# Altium schematic symbol library jlcpcb_2025_04_capacitors_extended_0201.schlib: 1175 symbols (part 5 of 7) (continued)
## GRM035R60J475ME15D
designator C?  Capacitance: 4.7uF  (hidden comment: *)
Capacitor, Ceramic (MLCC), 4.7uF, ±20%, 6.3V, X5R, ±20%, SMD 0201; Manufacturer: Murata Electronics; Manufacturer Part Number: GRM035R60J475ME15D; Package Size: 0201; JLCPCB Basic Part: No; JLCPCB Part Number: C335103; Supplier 1: LCSC; Category: Capacitors - MLCC; Supplier Part Number 1: C335103; Tolerance: ±20%; Voltage Rating: 6.3V; Temperature Coefficient: X5R; RoHS: Yes; ComponentLink1Description: Datasheet; ComponentLink1URL: https://wmsc.lcsc.com/wmsc/upload/file/pdf/v2/lcsc/2304140030_Murata-Electronics-GRM035R60J475ME15D_C335103.pdf; ComponentLink2Description: JLCPCB Part URL; ComponentLink2URL: https://jlcpcb.com/partdetail/C335103; ComponentLink3Description: LCSC Part URL; ComponentLink3URL: https://lcsc.com/product-detail/Multilayer-Ceramic-Capacitors-MLCC---SMD-SMT_Murata-Electronics-Murata-Electronics-GRM035R60J475ME15D_C335103.html
footprint CAP-0201 (0201 (0603M) Capacitor)
pins: 1, 2

## GRM0332C1H8R0WA01D
designator C?  Capacitance: 8pF  (hidden comment: *)
Capacitor, Ceramic (MLCC), 8pF, 50V, CH, SMD 0201; Manufacturer: Murata Electronics; Manufacturer Part Number: GRM0332C1H8R0WA01D; Package Size: 0201; JLCPCB Basic Part: No; JLCPCB Part Number: C161366; Supplier 1: LCSC; Category: Capacitors - MLCC; Supplier Part Number 1: C161366; Voltage Rating: 50V; Temperature Coefficient: CH; RoHS: Yes; ComponentLink1Description: Datasheet; ComponentLink1URL: https://wmsc.lcsc.com/wmsc/upload/file/pdf/v2/lcsc/1811081551_Murata-Electronics-GRM0332C1H8R0WA01D_C161366.pdf; ComponentLink2Description: JLCPCB Part URL; ComponentLink2URL: https://jlcpcb.com/partdetail/C161366; ComponentLink3Description: LCSC Part URL; ComponentLink3URL: https://lcsc.com/product-detail/Multilayer-Ceramic-Capacitors-MLCC---SMD-SMT_Murata-Electronics-Murata-Electronics-GRM0332C1H8R0WA01D_C161366.html
footprint CAP-0201 (0201 (0603M) Capacitor)
pins: 1, 2

## GRM0332C1H180GA01D
designator C?  Capacitance: 18pF  (hidden comment: *)
Capacitor, Ceramic (MLCC), 18pF, ±2%, 50V, CH, ±2%, SMD 0201; Manufacturer: Murata Electronics; Manufacturer Part Number: GRM0332C1H180GA01D; Package Size: 0201; JLCPCB Basic Part: No; JLCPCB Part Number: C161364; Supplier 1: LCSC; Category: Capacitors - MLCC; Supplier Part Number 1: C161364; Tolerance: ±2%; Voltage Rating: 50V; Temperature Coefficient: CH; RoHS: Yes; ComponentLink1Description: Datasheet; ComponentLink1URL: https://wmsc.lcsc.com/wmsc/upload/file/pdf/v2/lcsc/1811081551_Murata-Electronics-GRM0332C1H180GA01D_C161364.pdf; ComponentLink2Description: JLCPCB Part URL; ComponentLink2URL: https://jlcpcb.com/partdetail/C161364; ComponentLink3Description: LCSC Part URL; ComponentLink3URL: https://lcsc.com/product-detail/Multilayer-Ceramic-Capacitors-MLCC---SMD-SMT_Murata-Electronics-Murata-Electronics-GRM0332C1H180GA01D_C161364.html
footprint CAP-0201 (0201 (0603M) Capacitor)
pins: 1, 2

## GRM0332C1H680GA01D
designator C?  Capacitance: 68pF  (hidden comment: *)
Capacitor, Ceramic (MLCC), 68pF, ±2%, 50V, CH, ±2%, SMD 0201; Manufacturer: Murata Electronics; Manufacturer Part Number: GRM0332C1H680GA01D; Package Size: 0201; JLCPCB Basic Part: No; JLCPCB Part Number: C161365; Supplier 1: LCSC; Category: Capacitors - MLCC; Supplier Part Number 1: C161365; Tolerance: ±2%; Voltage Rating: 50V; Temperature Coefficient: CH; RoHS: Yes; ComponentLink1Description: Datasheet; ComponentLink1URL: https://wmsc.lcsc.com/wmsc/upload/file/pdf/v2/lcsc/1811081513_Murata-Electronics-GRM0332C1H680GA01D_C161365.pdf; ComponentLink2Description: JLCPCB Part URL; ComponentLink2URL: https://jlcpcb.com/partdetail/C161365; ComponentLink3Description: LCSC Part URL; ComponentLink3URL: https://lcsc.com/product-detail/Multilayer-Ceramic-Capacitors-MLCC---SMD-SMT_Murata-Electronics-Murata-Electronics-GRM0332C1H680GA01D_C161365.html
footprint CAP-0201 (0201 (0603M) Capacitor)
pins: 1, 2

## GRM0333C1H2R2WA01D
designator C?  Capacitance: 2.2pF  (hidden comment: *)
Capacitor, Ceramic (MLCC), 2.2pF, 50V, CJ, SMD 0201; Manufacturer: Murata Electronics; Manufacturer Part Number: GRM0333C1H2R2WA01D; Package Size: 0201; JLCPCB Basic Part: No; JLCPCB Part Number: C161367; Supplier 1: LCSC; Category: Capacitors - MLCC; Supplier Part Number 1: C161367; Voltage Rating: 50V; Temperature Coefficient: CJ; RoHS: Yes; ComponentLink1Description: Datasheet; ComponentLink1URL: https://wmsc.lcsc.com/wmsc/upload/file/pdf/v2/lcsc/2304140030_Murata-Electronics-GRM0333C1H2R2WA01D_C161367.pdf; ComponentLink2Description: JLCPCB Part URL; ComponentLink2URL: https://jlcpcb.com/partdetail/C161367; ComponentLink3Description: LCSC Part URL; ComponentLink3URL: https://lcsc.com/product-detail/Multilayer-Ceramic-Capacitors-MLCC---SMD-SMT_Murata-Electronics-Murata-Electronics-GRM0333C1H2R2WA01D_C161367.html
footprint CAP-0201 (0201 (0603M) Capacitor)
pins: 1, 2

## GRM0335C1E1R0BA01D
designator C?  Capacitance: 1pF  (hidden comment: *)
Capacitor, Ceramic (MLCC), 1pF, 25V, C0G, SMD 0201; Manufacturer: Murata Electronics; Manufacturer Part Number: GRM0335C1E1R0BA01D; Package Size: 0201; JLCPCB Basic Part: No; JLCPCB Part Number: C88903; Supplier 1: LCSC; Category: Capacitors - MLCC; Supplier Part Number 1: C88903; Voltage Rating: 25V; Temperature Coefficient: C0G; RoHS: Yes; ComponentLink1Description: Datasheet; ComponentLink1URL: https://wmsc.lcsc.com/wmsc/upload/file/pdf/v2/lcsc/2304140030_Murata-Electronics-GRM0335C1E1R0BA01D_C88903.pdf; ComponentLink2Description: JLCPCB Part URL; ComponentLink2URL: https://jlcpcb.com/partdetail/C88903; ComponentLink3Description: LCSC Part URL; ComponentLink3URL: https://lcsc.com/product-detail/Multilayer-Ceramic-Capacitors-MLCC---SMD-SMT_Murata-Electronics-Murata-Electronics-GRM0335C1E1R0BA01D_C88903.html
footprint CAP-0201 (0201 (0603M) Capacitor)
pins: 1, 2

## GRM0335C1E1R0CA01D
designator C?  Capacitance: 1pF  (hidden comment: *)
Capacitor, Ceramic (MLCC), 1pF, 25V, C0G, SMD 0201; Manufacturer: Murata Electronics; Manufacturer Part Number: GRM0335C1E1R0CA01D; Package Size: 0201; JLCPCB Basic Part: No; JLCPCB Part Number: C161376; Supplier 1: LCSC; Category: Capacitors - MLCC; Supplier Part Number 1: C161376; Voltage Rating: 25V; Temperature Coefficient: C0G; RoHS: Yes; ComponentLink1Description: Datasheet; ComponentLink1URL: https://wmsc.lcsc.com/wmsc/upload/file/pdf/v2/lcsc/1811081521_Murata-Electronics-GRM0335C1E1R0CA01D_C161376.pdf; ComponentLink2Description: JLCPCB Part URL; ComponentLink2URL: https://jlcpcb.com/partdetail/C161376; ComponentLink3Description: LCSC Part URL; ComponentLink3URL: https://lcsc.com/product-detail/Multilayer-Ceramic-Capacitors-MLCC---SMD-SMT_Murata-Electronics-Murata-Electronics-GRM0335C1E1R0CA01D_C161376.html
footprint CAP-0201 (0201 (0603M) Capacitor)
pins: 1, 2

## GRM0335C1E1R1WA01D
designator C?  Capacitance: 1.1pF  (hidden comment: *)
Capacitor, Ceramic (MLCC), 1.1pF, 25V, SMD 0201; Manufacturer: Murata Electronics; Manufacturer Part Number: GRM0335C1E1R1WA01D; Package Size: 0201; JLCPCB Basic Part: No; JLCPCB Part Number: C2891569; Supplier 1: LCSC; Category: Capacitors - MLCC; Supplier Part Number 1: C2891569; Voltage Rating: 25V; RoHS: Yes; ComponentLink1Description: Datasheet; ComponentLink1URL: https://wmsc.lcsc.com/wmsc/upload/file/pdf/v2/lcsc/2109101130_Murata-Electronics-GRM0335C1E1R1WA01D_C2891569.pdf; ComponentLink2Description: JLCPCB Part URL; ComponentLink2URL: https://jlcpcb.com/partdetail/C2891569; ComponentLink3Description: LCSC Part URL; ComponentLink3URL: https://lcsc.com/product-detail/Multilayer-Ceramic-Capacitors-MLCC---SMD-SMT_Murata-Electronics-Murata-Electronics-GRM0335C1E1R1WA01D_C2891569.html
footprint CAP-0201 (0201 (0603M) Capacitor)
pins: 1, 2

## GRM0335C1E1R4BA01D
designator C?  Capacitance: 1.4pF  (hidden comment: *)
Capacitor, Ceramic (MLCC), 1.4pF, 25V, C0G, SMD 0201; Manufacturer: Murata Electronics; Manufacturer Part Number: GRM0335C1E1R4BA01D; Package Size: 0201; JLCPCB Basic Part: No; JLCPCB Part Number: C3879654; Supplier 1: LCSC; Category: Capacitors - MLCC; Supplier Part Number 1: C3879654; Voltage Rating: 25V; Temperature Coefficient: C0G; RoHS: Yes; ComponentLink1Description: Datasheet; ComponentLink1URL: https://wmsc.lcsc.com/wmsc/upload/file/pdf/v2/lcsc/2308111757_Murata-Electronics-GRM0335C1E1R4BA01D_C3879654.pdf; ComponentLink2Description: JLCPCB Part URL; ComponentLink2URL: https://jlcpcb.com/partdetail/C3879654; ComponentLink3Description: LCSC Part URL; ComponentLink3URL: https://lcsc.com/product-detail/Multilayer-Ceramic-Capacitors-MLCC---SMD-SMT_Murata-Electronics-Murata-Electronics-GRM0335C1E1R4BA01D_C3879654.html
footprint CAP-0201 (0201 (0603M) Capacitor)
pins: 1, 2

## GRM0335C1E1R5CA01D
designator C?  Capacitance: 1.5pF  (hidden comment: *)
Capacitor, Ceramic (MLCC), 1.5pF, 25V, C0G, SMD 0201; Manufacturer: Murata Electronics; Manufacturer Part Number: GRM0335C1E1R5CA01D; Package Size: 0201; JLCPCB Basic Part: No; JLCPCB Part Number: C161378; Supplier 1: LCSC; Category: Capacitors - MLCC; Supplier Part Number 1: C161378; Voltage Rating: 25V; Temperature Coefficient: C0G; RoHS: Yes; ComponentLink1Description: Datasheet; ComponentLink1URL: https://wmsc.lcsc.com/wmsc/upload/file/pdf/v2/lcsc/2304140030_Murata-Electronics-GRM0335C1E1R5CA01D_C161378.pdf; ComponentLink2Description: JLCPCB Part URL; ComponentLink2URL: https://jlcpcb.com/partdetail/C161378; ComponentLink3Description: LCSC Part URL; ComponentLink3URL: https://lcsc.com/product-detail/Multilayer-Ceramic-Capacitors-MLCC---SMD-SMT_Murata-Electronics-Murata-Electronics-GRM0335C1E1R5CA01D_C161378.html
footprint CAP-0201 (0201 (0603M) Capacitor)
pins: 1, 2

## GRM0335C1E1R5WA01D
designator C?  Capacitance: 1.5pF  (hidden comment: *)
Capacitor, Ceramic (MLCC), 1.5pF, 25V, C0G, SMD 0201; Manufacturer: Murata Electronics; Manufacturer Part Number: GRM0335C1E1R5WA01D; Package Size: 0201; JLCPCB Basic Part: No; JLCPCB Part Number: C668510; Supplier 1: LCSC; Category: Capacitors - MLCC; Supplier Part Number 1: C668510; Voltage Rating: 25V; Temperature Coefficient: C0G; RoHS: Yes; ComponentLink1Description: Datasheet; ComponentLink1URL: https://wmsc.lcsc.com/wmsc/upload/file/pdf/v2/lcsc/2007241808_Murata-Electronics-GRM0335C1E1R5WA01D_C668510.pdf; ComponentLink2Description: JLCPCB Part URL; ComponentLink2URL: https://jlcpcb.com/partdetail/C668510; ComponentLink3Description: LCSC Part URL; ComponentLink3URL: https://lcsc.com/product-detail/Multilayer-Ceramic-Capacitors-MLCC---SMD-SMT_Murata-Electronics-Murata-Electronics-GRM0335C1E1R5WA01D_C668510.html
footprint CAP-0201 (0201 (0603M) Capacitor)
pins: 1, 2

## GRM0335C1E1R6BA01D
designator C?  Capacitance: 1.6pF  (hidden comment: *)
Capacitor, Ceramic (MLCC), 1.6pF, 25V, C0G, SMD 0201; Manufacturer: Murata Electronics; Manufacturer Part Number: GRM0335C1E1R6BA01D; Package Size: 0201; JLCPCB Basic Part: No; JLCPCB Part Number: C464959; Supplier 1: LCSC; Category: Capacitors - MLCC; Supplier Part Number 1: C464959; Voltage Rating: 25V; Temperature Coefficient: C0G; RoHS: Yes; ComponentLink1Description: Datasheet; ComponentLink1URL: https://wmsc.lcsc.com/wmsc/upload/file/pdf/v2/lcsc/1912111437_Murata-Electronics-GRM0335C1E1R6BA01D_C464959.pdf; ComponentLink2Description: JLCPCB Part URL; ComponentLink2URL: https://jlcpcb.com/partdetail/C464959; ComponentLink3Description: LCSC Part URL; ComponentLink3URL: https://lcsc.com/product-detail/Multilayer-Ceramic-Capacitors-MLCC---SMD-SMT_Murata-Electronics-Murata-Electronics-GRM0335C1E1R6BA01D_C464959.html
footprint CAP-0201 (0201 (0603M) Capacitor)
pins: 1, 2

## GRM0335C1E1R8BA01D
designator C?  Capacitance: 1.8pF  (hidden comment: *)
Capacitor, Ceramic (MLCC), 1.8pF, 25V, C0G, SMD 0201; Manufacturer: Murata Electronics; Manufacturer Part Number: GRM0335C1E1R8BA01D; Package Size: 0201; JLCPCB Basic Part: No; JLCPCB Part Number: C161379; Supplier 1: LCSC; Category: Capacitors - MLCC; Supplier Part Number 1: C161379; Voltage Rating: 25V; Temperature Coefficient: C0G; RoHS: Yes; ComponentLink1Description: Datasheet; ComponentLink1URL: https://wmsc.lcsc.com/wmsc/upload/file/pdf/v2/lcsc/1811081551_Murata-Electronics-GRM0335C1E1R8BA01D_C161379.pdf; ComponentLink2Description: JLCPCB Part URL; ComponentLink2URL: https://jlcpcb.com/partdetail/C161379; ComponentLink3Description: LCSC Part URL; ComponentLink3URL: https://lcsc.com/product-detail/Multilayer-Ceramic-Capacitors-MLCC---SMD-SMT_Murata-Electronics-Murata-Electronics-GRM0335C1E1R8BA01D_C161379.html
footprint CAP-0201 (0201 (0603M) Capacitor)
pins: 1, 2

## GRM0335C1E1R8CA01D
designator C?  Capacitance: 1.8pF  (hidden comment: *)
Capacitor, Ceramic (MLCC), 1.8pF, 25V, C0G, SMD 0201; Manufacturer: Murata Electronics; Manufacturer Part Number: GRM0335C1E1R8CA01D; Package Size: 0201; JLCPCB Basic Part: No; JLCPCB Part Number: C161380; Supplier 1: LCSC; Category: Capacitors - MLCC; Supplier Part Number 1: C161380; Voltage Rating: 25V; Temperature Coefficient: C0G; RoHS: Yes; ComponentLink1Description: Datasheet; ComponentLink1URL: https://wmsc.lcsc.com/wmsc/upload/file/pdf/v2/lcsc/1811081545_Murata-Electronics-GRM0335C1E1R8CA01D_C161380.pdf; ComponentLink2Description: JLCPCB Part URL; ComponentLink2URL: https://jlcpcb.com/partdetail/C161380; ComponentLink3Description: LCSC Part URL; ComponentLink3URL: https://lcsc.com/product-detail/Multilayer-Ceramic-Capacitors-MLCC---SMD-SMT_Murata-Electronics-Murata-Electronics-GRM0335C1E1R8CA01D_C161380.html
footprint CAP-0201 (0201 (0603M) Capacitor)
pins: 1, 2

## GRM0335C1E2R0BA01D
designator C?  Capacitance: 2pF  (hidden comment: *)
Capacitor, Ceramic (MLCC), 2pF, 25V, C0G, SMD 0201; Manufacturer: Murata Electronics; Manufacturer Part Number: GRM0335C1E2R0BA01D; Package Size: 0201; JLCPCB Basic Part: No; JLCPCB Part Number: C161383; Supplier 1: LCSC; Category: Capacitors - MLCC; Supplier Part Number 1: C161383; Voltage Rating: 25V; Temperature Coefficient: C0G; RoHS: Yes; ComponentLink1Description: Datasheet; ComponentLink1URL: https://wmsc.lcsc.com/wmsc/upload/file/pdf/v2/lcsc/1811081530_Murata-Electronics-GRM0335C1E2R0BA01D_C161383.pdf; ComponentLink2Description: JLCPCB Part URL; ComponentLink2URL: https://jlcpcb.com/partdetail/C161383; ComponentLink3Description: LCSC Part URL; ComponentLink3URL: https://lcsc.com/product-detail/Multilayer-Ceramic-Capacitors-MLCC---SMD-SMT_Murata-Electronics-Murata-Electronics-GRM0335C1E2R0BA01D_C161383.html
footprint CAP-0201 (0201 (0603M) Capacitor)
pins: 1, 2

## GRM0335C1E2R2CA01D
designator C?  Capacitance: 2.2pF  (hidden comment: *)
Capacitor, Ceramic (MLCC), 2.2pF, 25V, C0G, SMD 0201; Manufacturer: Murata Electronics; Manufacturer Part Number: GRM0335C1E2R2CA01D; Package Size: 0201; JLCPCB Basic Part: No; JLCPCB Part Number: C161384; Supplier 1: LCSC; Category: Capacitors - MLCC; Supplier Part Number 1: C161384; Voltage Rating: 25V; Temperature Coefficient: C0G; RoHS: Yes; ComponentLink1Description: Datasheet; ComponentLink1URL: https://wmsc.lcsc.com/wmsc/upload/file/pdf/v2/lcsc/2304140030_Murata-Electronics-GRM0335C1E2R2CA01D_C161384.pdf; ComponentLink2Description: JLCPCB Part URL; ComponentLink2URL: https://jlcpcb.com/partdetail/C161384; ComponentLink3Description: LCSC Part URL; ComponentLink3URL: https://lcsc.com/product-detail/Multilayer-Ceramic-Capacitors-MLCC---SMD-SMT_Murata-Electronics-Murata-Electronics-GRM0335C1E2R2CA01D_C161384.html
footprint CAP-0201 (0201 (0603M) Capacitor)
pins: 1, 2

## GRM0335C1E2R7BA01D
designator C?  Capacitance: 2.7pF  (hidden comment: *)
Capacitor, Ceramic (MLCC), 2.7pF, 25V, C0G, SMD 0201; Manufacturer: Murata Electronics; Manufacturer Part Number: GRM0335C1E2R7BA01D; Package Size: 0201; JLCPCB Basic Part: No; JLCPCB Part Number: C464961; Supplier 1: LCSC; Category: Capacitors - MLCC; Supplier Part Number 1: C464961; Voltage Rating: 25V; Temperature Coefficient: C0G; RoHS: Yes; ComponentLink1Description: Datasheet; ComponentLink1URL: https://wmsc.lcsc.com/wmsc/upload/file/pdf/v2/lcsc/1912111437_Murata-Electronics-GRM0335C1E2R7BA01D_C464961.pdf; ComponentLink2Description: JLCPCB Part URL; ComponentLink2URL: https://jlcpcb.com/partdetail/C464961; ComponentLink3Description: LCSC Part URL; ComponentLink3URL: https://lcsc.com/product-detail/Multilayer-Ceramic-Capacitors-MLCC---SMD-SMT_Murata-Electronics-Murata-Electronics-GRM0335C1E2R7BA01D_C464961.html
footprint CAP-0201 (0201 (0603M) Capacitor)
pins: 1, 2

## GRM0335C1E3R0CA01D
designator C?  Capacitance: 3pF  (hidden comment: *)
Capacitor, Ceramic (MLCC), 3pF, 25V, C0G, SMD 0201; Manufacturer: Murata Electronics; Manufacturer Part Number: GRM0335C1E3R0CA01D; Package Size: 0201; JLCPCB Basic Part: No; JLCPCB Part Number: C161388; Supplier 1: LCSC; Category: Capacitors - MLCC; Supplier Part Number 1: C161388; Voltage Rating: 25V; Temperature Coefficient: C0G; RoHS: Yes; ComponentLink1Description: Datasheet; ComponentLink1URL: https://wmsc.lcsc.com/wmsc/upload/file/pdf/v2/lcsc/2304140030_Murata-Electronics-GRM0335C1E3R0CA01D_C161388.pdf; ComponentLink2Description: JLCPCB Part URL; ComponentLink2URL: https://jlcpcb.com/partdetail/C161388; ComponentLink3Description: LCSC Part URL; ComponentLink3URL: https://lcsc.com/product-detail/Multilayer-Ceramic-Capacitors-MLCC---SMD-SMT_Murata-Electronics-Murata-Electronics-GRM0335C1E3R0CA01D_C161388.html
footprint CAP-0201 (0201 (0603M) Capacitor)
pins: 1, 2

## GRM0335C1E3R3CD01D
designator C?  Capacitance: 3.3pF  (hidden comment: *)
Capacitor, Ceramic (MLCC), 3.3pF, 25V, C0G, SMD 0201; Manufacturer: Murata Electronics; Manufacturer Part Number: GRM0335C1E3R3CD01D; Package Size: 0201; JLCPCB Basic Part: No; JLCPCB Part Number: C337493; Supplier 1: LCSC; Category: Capacitors - MLCC; Supplier Part Number 1: C337493; Voltage Rating: 25V; Temperature Coefficient: C0G; RoHS: Yes; ComponentLink1Description: Datasheet; ComponentLink1URL: https://wmsc.lcsc.com/wmsc/upload/file/pdf/v2/lcsc/2304140030_Murata-Electronics-GRM0335C1E3R3CD01D_C337493.pdf; ComponentLink2Description: JLCPCB Part URL; ComponentLink2URL: https://jlcpcb.com/partdetail/C337493; ComponentLink3Description: LCSC Part URL; ComponentLink3URL: https://lcsc.com/product-detail/Multilayer-Ceramic-Capacitors-MLCC---SMD-SMT_Murata-Electronics-Murata-Electronics-GRM0335C1E3R3CD01D_C337493.html
footprint CAP-0201 (0201 (0603M) Capacitor)
pins: 1, 2

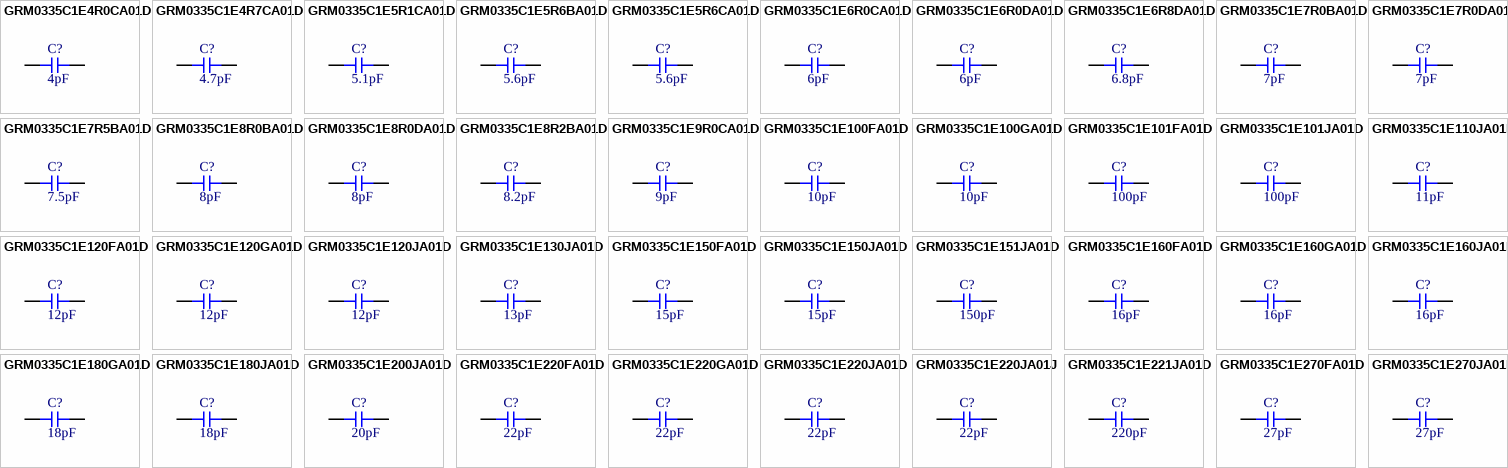
[diagram p20: symbols GRM0335C1E4R0CA01D to GRM0335C1E270JA01D]

## GRM0335C1E4R0CA01D
designator C?  Capacitance: 4pF  (hidden comment: *)
Capacitor, Ceramic (MLCC), 4pF, 25V, C0G, SMD 0201; Manufacturer: Murata Electronics; Manufacturer Part Number: GRM0335C1E4R0CA01D; Package Size: 0201; JLCPCB Basic Part: No; JLCPCB Part Number: C161391; Supplier 1: LCSC; Category: Capacitors - MLCC; Supplier Part Number 1: C161391; Voltage Rating: 25V; Temperature Coefficient: C0G; RoHS: Yes; ComponentLink1Description: Datasheet; ComponentLink1URL: https://wmsc.lcsc.com/wmsc/upload/file/pdf/v2/lcsc/2304140030_Murata-Electronics-GRM0335C1E4R0CA01D_C161391.pdf; ComponentLink2Description: JLCPCB Part URL; ComponentLink2URL: https://jlcpcb.com/partdetail/C161391; ComponentLink3Description: LCSC Part URL; ComponentLink3URL: https://lcsc.com/product-detail/Multilayer-Ceramic-Capacitors-MLCC---SMD-SMT_Murata-Electronics-Murata-Electronics-GRM0335C1E4R0CA01D_C161391.html
footprint CAP-0201 (0201 (0603M) Capacitor)
pins: 1, 2

## GRM0335C1E4R7CA01D
designator C?  Capacitance: 4.7pF  (hidden comment: *)
Capacitor, Ceramic (MLCC), 4.7pF, 25V, C0G, SMD 0201; Manufacturer: Murata Electronics; Manufacturer Part Number: GRM0335C1E4R7CA01D; Package Size: 0201; JLCPCB Basic Part: No; JLCPCB Part Number: C426114; Supplier 1: LCSC; Category: Capacitors - MLCC; Supplier Part Number 1: C426114; Voltage Rating: 25V; Temperature Coefficient: C0G; RoHS: Yes; ComponentLink1Description: Datasheet; ComponentLink1URL: https://wmsc.lcsc.com/wmsc/upload/file/pdf/v2/lcsc/2304140030_Murata-Electronics-GRM0335C1E4R7CA01D_C426114.pdf; ComponentLink2Description: JLCPCB Part URL; ComponentLink2URL: https://jlcpcb.com/partdetail/C426114; ComponentLink3Description: LCSC Part URL; ComponentLink3URL: https://lcsc.com/product-detail/Multilayer-Ceramic-Capacitors-MLCC---SMD-SMT_Murata-Electronics-Murata-Electronics-GRM0335C1E4R7CA01D_C426114.html
footprint CAP-0201 (0201 (0603M) Capacitor)
pins: 1, 2

## GRM0335C1E5R1CA01D
designator C?  Capacitance: 5.1pF  (hidden comment: *)
Capacitor, Ceramic (MLCC), 5.1pF, 25V, null, SMD 0201; Manufacturer: Murata Electronics; Manufacturer Part Number: GRM0335C1E5R1CA01D; Package Size: 0201; JLCPCB Basic Part: No; JLCPCB Part Number: C710802; Supplier 1: LCSC; Category: Capacitors - MLCC; Supplier Part Number 1: C710802; Voltage Rating: 25V; Temperature Coefficient: null; RoHS: Yes; ComponentLink1Description: Datasheet; ComponentLink1URL: https://wmsc.lcsc.com/wmsc/upload/file/pdf/v2/lcsc/2103161034_Murata-Electronics-GRM0335C1E5R1CA01D_C710802.pdf; ComponentLink2Description: JLCPCB Part URL; ComponentLink2URL: https://jlcpcb.com/partdetail/C710802; ComponentLink3Description: LCSC Part URL; ComponentLink3URL: https://lcsc.com/product-detail/Multilayer-Ceramic-Capacitors-MLCC---SMD-SMT_Murata-Electronics-Murata-Electronics-GRM0335C1E5R1CA01D_C710802.html
footprint CAP-0201 (0201 (0603M) Capacitor)
pins: 1, 2

## GRM0335C1E5R6BA01D
designator C?  Capacitance: 5.6pF  (hidden comment: *)
Capacitor, Ceramic (MLCC), 5.6pF, 25V, null, SMD 0201; Manufacturer: Murata Electronics; Manufacturer Part Number: GRM0335C1E5R6BA01D; Package Size: 0201; JLCPCB Basic Part: No; JLCPCB Part Number: C237563; Supplier 1: LCSC; Category: Capacitors - MLCC; Supplier Part Number 1: C237563; Voltage Rating: 25V; Temperature Coefficient: null; RoHS: Yes; ComponentLink1Description: Datasheet; ComponentLink1URL: https://wmsc.lcsc.com/wmsc/upload/file/pdf/v2/lcsc/2304140030_Murata-Electronics-GRM0335C1E5R6BA01D_C237563.pdf; ComponentLink2Description: JLCPCB Part URL; ComponentLink2URL: https://jlcpcb.com/partdetail/C237563; ComponentLink3Description: LCSC Part URL; ComponentLink3URL: https://lcsc.com/product-detail/Multilayer-Ceramic-Capacitors-MLCC---SMD-SMT_Murata-Electronics-Murata-Electronics-GRM0335C1E5R6BA01D_C237563.html
footprint CAP-0201 (0201 (0603M) Capacitor)
pins: 1, 2

## GRM0335C1E5R6CA01D
designator C?  Capacitance: 5.6pF  (hidden comment: *)
Capacitor, Ceramic (MLCC), 5.6pF, 25V, C0G, SMD 0201; Manufacturer: Murata Electronics; Manufacturer Part Number: GRM0335C1E5R6CA01D; Package Size: 0201; JLCPCB Basic Part: No; JLCPCB Part Number: C437511; Supplier 1: LCSC; Category: Capacitors - MLCC; Supplier Part Number 1: C437511; Voltage Rating: 25V; Temperature Coefficient: C0G; RoHS: Yes; ComponentLink1Description: Datasheet; ComponentLink1URL: https://wmsc.lcsc.com/wmsc/upload/file/pdf/v2/lcsc/2304140030_Murata-Electronics-GRM0335C1E5R6CA01D_C437511.pdf; ComponentLink2Description: JLCPCB Part URL; ComponentLink2URL: https://jlcpcb.com/partdetail/C437511; ComponentLink3Description: LCSC Part URL; ComponentLink3URL: https://lcsc.com/product-detail/Multilayer-Ceramic-Capacitors-MLCC---SMD-SMT_Murata-Electronics-Murata-Electronics-GRM0335C1E5R6CA01D_C437511.html
footprint CAP-0201 (0201 (0603M) Capacitor)
pins: 1, 2

## GRM0335C1E6R0CA01D
designator C?  Capacitance: 6pF  (hidden comment: *)
Capacitor, Ceramic (MLCC), 6pF, 25V, C0G, SMD 0201; Manufacturer: Murata Electronics; Manufacturer Part Number: GRM0335C1E6R0CA01D; Package Size: 0201; JLCPCB Basic Part: No; JLCPCB Part Number: C237528; Supplier 1: LCSC; Category: Capacitors - MLCC; Supplier Part Number 1: C237528; Voltage Rating: 25V; Temperature Coefficient: C0G; RoHS: Yes; ComponentLink1Description: Datasheet; ComponentLink1URL: https://wmsc.lcsc.com/wmsc/upload/file/pdf/v2/lcsc/2304140030_Murata-Electronics-GRM0335C1E6R0CA01D_C237528.pdf; ComponentLink2Description: JLCPCB Part URL; ComponentLink2URL: https://jlcpcb.com/partdetail/C237528; ComponentLink3Description: LCSC Part URL; ComponentLink3URL: https://lcsc.com/product-detail/Multilayer-Ceramic-Capacitors-MLCC---SMD-SMT_Murata-Electronics-Murata-Electronics-GRM0335C1E6R0CA01D_C237528.html
footprint CAP-0201 (0201 (0603M) Capacitor)
pins: 1, 2

## GRM0335C1E6R0DA01D
designator C?  Capacitance: 6pF  (hidden comment: *)
Capacitor, Ceramic (MLCC), 6pF, 25V, C0G, SMD 0201; Manufacturer: Murata Electronics; Manufacturer Part Number: GRM0335C1E6R0DA01D; Package Size: 0201; JLCPCB Basic Part: No; JLCPCB Part Number: C161395; Supplier 1: LCSC; Category: Capacitors - MLCC; Supplier Part Number 1: C161395; Voltage Rating: 25V; Temperature Coefficient: C0G; RoHS: Yes; ComponentLink1Description: Datasheet; ComponentLink1URL: https://wmsc.lcsc.com/wmsc/upload/file/pdf/v2/lcsc/1912111437_Murata-Electronics-GRM0335C1E6R0DA01D_C161395.pdf; ComponentLink2Description: JLCPCB Part URL; ComponentLink2URL: https://jlcpcb.com/partdetail/C161395; ComponentLink3Description: LCSC Part URL; ComponentLink3URL: https://lcsc.com/product-detail/Multilayer-Ceramic-Capacitors-MLCC---SMD-SMT_Murata-Electronics-Murata-Electronics-GRM0335C1E6R0DA01D_C161395.html
footprint CAP-0201 (0201 (0603M) Capacitor)
pins: 1, 2

## GRM0335C1E6R8DA01D
designator C?  Capacitance: 6.8pF  (hidden comment: *)
Capacitor, Ceramic (MLCC), 6.8pF, 25V, C0G, SMD 0201; Manufacturer: Murata Electronics; Manufacturer Part Number: GRM0335C1E6R8DA01D; Package Size: 0201; JLCPCB Basic Part: No; JLCPCB Part Number: C161396; Supplier 1: LCSC; Category: Capacitors - MLCC; Supplier Part Number 1: C161396; Voltage Rating: 25V; Temperature Coefficient: C0G; RoHS: Yes; ComponentLink1Description: Datasheet; ComponentLink1URL: https://wmsc.lcsc.com/wmsc/upload/file/pdf/v2/lcsc/1811081551_Murata-Electronics-GRM0335C1E6R8DA01D_C161396.pdf; ComponentLink2Description: JLCPCB Part URL; ComponentLink2URL: https://jlcpcb.com/partdetail/C161396; ComponentLink3Description: LCSC Part URL; ComponentLink3URL: https://lcsc.com/product-detail/Multilayer-Ceramic-Capacitors-MLCC---SMD-SMT_Murata-Electronics-Murata-Electronics-GRM0335C1E6R8DA01D_C161396.html
footprint CAP-0201 (0201 (0603M) Capacitor)
pins: 1, 2

## GRM0335C1E7R0BA01D
designator C?  Capacitance: 7pF  (hidden comment: *)
Capacitor, Ceramic (MLCC), 7pF, 25V, C0G, SMD 0201; Manufacturer: Murata Electronics; Manufacturer Part Number: GRM0335C1E7R0BA01D; Package Size: 0201; JLCPCB Basic Part: No; JLCPCB Part Number: C3868891; Supplier 1: LCSC; Category: Capacitors - MLCC; Supplier Part Number 1: C3868891; Voltage Rating: 25V; Temperature Coefficient: C0G; RoHS: Yes; ComponentLink1Description: Datasheet; ComponentLink1URL: https://wmsc.lcsc.com/wmsc/upload/file/pdf/v2/lcsc/2401242310_Murata-Electronics-GRM0335C1E7R0BA01D_C3868891.pdf; ComponentLink2Description: JLCPCB Part URL; ComponentLink2URL: https://jlcpcb.com/partdetail/C3868891; ComponentLink3Description: LCSC Part URL; ComponentLink3URL: https://lcsc.com/product-detail/Multilayer-Ceramic-Capacitors-MLCC---SMD-SMT_Murata-Electronics-Murata-Electronics-GRM0335C1E7R0BA01D_C3868891.html
footprint CAP-0201 (0201 (0603M) Capacitor)
pins: 1, 2

## GRM0335C1E7R0DA01D
designator C?  Capacitance: 7pF  (hidden comment: *)
Capacitor, Ceramic (MLCC), 7pF, 25V, C0G, SMD 0201; Manufacturer: Murata Electronics; Manufacturer Part Number: GRM0335C1E7R0DA01D; Package Size: 0201; JLCPCB Basic Part: No; JLCPCB Part Number: C2988758; Supplier 1: LCSC; Category: Capacitors - MLCC; Supplier Part Number 1: C2988758; Voltage Rating: 25V; Temperature Coefficient: C0G; RoHS: Yes; ComponentLink1Description: Datasheet; ComponentLink1URL: https://wmsc.lcsc.com/wmsc/upload/file/pdf/v2/lcsc/2204151800_Murata-Electronics-GRM0335C1E7R0DA01D_C2988758.pdf; ComponentLink2Description: JLCPCB Part URL; ComponentLink2URL: https://jlcpcb.com/partdetail/C2988758; ComponentLink3Description: LCSC Part URL; ComponentLink3URL: https://lcsc.com/product-detail/Multilayer-Ceramic-Capacitors-MLCC---SMD-SMT_Murata-Electronics-Murata-Electronics-GRM0335C1E7R0DA01D_C2988758.html
footprint CAP-0201 (0201 (0603M) Capacitor)
pins: 1, 2

## GRM0335C1E7R5BA01D
designator C?  Capacitance: 7.5pF  (hidden comment: *)
Capacitor, Ceramic (MLCC), 7.5pF, 25V, C0G, SMD 0201; Manufacturer: Murata Electronics; Manufacturer Part Number: GRM0335C1E7R5BA01D; Package Size: 0201; JLCPCB Basic Part: No; JLCPCB Part Number: C3839097; Supplier 1: LCSC; Category: Capacitors - MLCC; Supplier Part Number 1: C3839097; Voltage Rating: 25V; Temperature Coefficient: C0G; RoHS: Yes; ComponentLink1Description: Datasheet; ComponentLink1URL: https://wmsc.lcsc.com/wmsc/upload/file/pdf/v2/lcsc/2308111457_Murata-Electronics-GRM0335C1E7R5BA01D_C3839097.pdf; ComponentLink2Description: JLCPCB Part URL; ComponentLink2URL: https://jlcpcb.com/partdetail/C3839097; ComponentLink3Description: LCSC Part URL; ComponentLink3URL: https://lcsc.com/product-detail/Multilayer-Ceramic-Capacitors-MLCC---SMD-SMT_Murata-Electronics-Murata-Electronics-GRM0335C1E7R5BA01D_C3839097.html
footprint CAP-0201 (0201 (0603M) Capacitor)
pins: 1, 2

## GRM0335C1E8R0BA01D
designator C?  Capacitance: 8pF  (hidden comment: *)
Capacitor, Ceramic (MLCC), 8pF, 25V, SMD 0201; Manufacturer: Murata Electronics; Manufacturer Part Number: GRM0335C1E8R0BA01D; Package Size: 0201; JLCPCB Basic Part: No; JLCPCB Part Number: C384954; Supplier 1: LCSC; Category: Capacitors - MLCC; Supplier Part Number 1: C384954; Voltage Rating: 25V; RoHS: Yes; ComponentLink1Description: Datasheet; ComponentLink1URL: https://wmsc.lcsc.com/wmsc/upload/file/pdf/v2/lcsc/2308111630_Murata-Electronics-GRM0335C1E8R0BA01D_C384954.pdf; ComponentLink2Description: JLCPCB Part URL; ComponentLink2URL: https://jlcpcb.com/partdetail/C384954; ComponentLink3Description: LCSC Part URL; ComponentLink3URL: https://lcsc.com/product-detail/Multilayer-Ceramic-Capacitors-MLCC---SMD-SMT_Murata-Electronics-Murata-Electronics-GRM0335C1E8R0BA01D_C384954.html
footprint CAP-0201 (0201 (0603M) Capacitor)
pins: 1, 2

## GRM0335C1E8R0DA01D
designator C?  Capacitance: 8pF  (hidden comment: *)
Capacitor, Ceramic (MLCC), 8pF, 25V, C0G, SMD 0201; Manufacturer: Murata Electronics; Manufacturer Part Number: GRM0335C1E8R0DA01D; Package Size: 0201; JLCPCB Basic Part: No; JLCPCB Part Number: C161398; Supplier 1: LCSC; Category: Capacitors - MLCC; Supplier Part Number 1: C161398; Voltage Rating: 25V; Temperature Coefficient: C0G; RoHS: Yes; ComponentLink1Description: Datasheet; ComponentLink1URL: https://wmsc.lcsc.com/wmsc/upload/file/pdf/v2/lcsc/1811081545_Murata-Electronics-GRM0335C1E8R0DA01D_C161398.pdf; ComponentLink2Description: JLCPCB Part URL; ComponentLink2URL: https://jlcpcb.com/partdetail/C161398; ComponentLink3Description: LCSC Part URL; ComponentLink3URL: https://lcsc.com/product-detail/Multilayer-Ceramic-Capacitors-MLCC---SMD-SMT_Murata-Electronics-Murata-Electronics-GRM0335C1E8R0DA01D_C161398.html
footprint CAP-0201 (0201 (0603M) Capacitor)
pins: 1, 2

## GRM0335C1E8R2BA01D
designator C?  Capacitance: 8.2pF  (hidden comment: *)
Capacitor, Ceramic (MLCC), 8.2pF, 25V, C0G, SMD 0201; Manufacturer: Murata Electronics; Manufacturer Part Number: GRM0335C1E8R2BA01D; Package Size: 0201; JLCPCB Basic Part: No; JLCPCB Part Number: C161399; Supplier 1: LCSC; Category: Capacitors - MLCC; Supplier Part Number 1: C161399; Voltage Rating: 25V; Temperature Coefficient: C0G; RoHS: Yes; ComponentLink1Description: Datasheet; ComponentLink1URL: https://wmsc.lcsc.com/wmsc/upload/file/pdf/v2/lcsc/1811081546_Murata-Electronics-GRM0335C1E8R2BA01D_C161399.pdf; ComponentLink2Description: JLCPCB Part URL; ComponentLink2URL: https://jlcpcb.com/partdetail/C161399; ComponentLink3Description: LCSC Part URL; ComponentLink3URL: https://lcsc.com/product-detail/Multilayer-Ceramic-Capacitors-MLCC---SMD-SMT_Murata-Electronics-Murata-Electronics-GRM0335C1E8R2BA01D_C161399.html
footprint CAP-0201 (0201 (0603M) Capacitor)
pins: 1, 2

## GRM0335C1E9R0CA01D
designator C?  Capacitance: 9pF  (hidden comment: *)
Capacitor, Ceramic (MLCC), 9pF, 25V, C0G, SMD 0201; Manufacturer: Murata Electronics; Manufacturer Part Number: GRM0335C1E9R0CA01D; Package Size: 0201; JLCPCB Basic Part: No; JLCPCB Part Number: C237292; Supplier 1: LCSC; Category: Capacitors - MLCC; Supplier Part Number 1: C237292; Voltage Rating: 25V; Temperature Coefficient: C0G; RoHS: Yes; ComponentLink1Description: Datasheet; ComponentLink1URL: https://wmsc.lcsc.com/wmsc/upload/file/pdf/v2/lcsc/2304140030_Murata-Electronics-GRM0335C1E9R0CA01D_C237292.pdf; ComponentLink2Description: JLCPCB Part URL; ComponentLink2URL: https://jlcpcb.com/partdetail/C237292; ComponentLink3Description: LCSC Part URL; ComponentLink3URL: https://lcsc.com/product-detail/Multilayer-Ceramic-Capacitors-MLCC---SMD-SMT_Murata-Electronics-Murata-Electronics-GRM0335C1E9R0CA01D_C237292.html
footprint CAP-0201 (0201 (0603M) Capacitor)
pins: 1, 2

## GRM0335C1E100FA01D
designator C?  Capacitance: 10pF  (hidden comment: *)
Capacitor, Ceramic (MLCC), 10pF, ±1%, ±1%, SMD 0201; Manufacturer: Murata Electronics; Manufacturer Part Number: GRM0335C1E100FA01D; Package Size: 0201; JLCPCB Basic Part: No; JLCPCB Part Number: C710790; Supplier 1: LCSC; Category: Capacitors - MLCC; Supplier Part Number 1: C710790; Tolerance: ±1%; RoHS: Yes; ComponentLink1Description: Datasheet; ComponentLink1URL: https://wmsc.lcsc.com/wmsc/upload/file/pdf/v2/lcsc/2012231244_Murata-Electronics-GRM0335C1E100FA01D_C710790.pdf; ComponentLink2Description: JLCPCB Part URL; ComponentLink2URL: https://jlcpcb.com/partdetail/C710790; ComponentLink3Description: LCSC Part URL; ComponentLink3URL: https://lcsc.com/product-detail/Multilayer-Ceramic-Capacitors-MLCC---SMD-SMT_Murata-Electronics-Murata-Electronics-GRM0335C1E100FA01D_C710790.html
footprint CAP-0201 (0201 (0603M) Capacitor)
pins: 1, 2

## GRM0335C1E100GA01D
designator C?  Capacitance: 10pF  (hidden comment: *)
Capacitor, Ceramic (MLCC), 10pF, ±2%, 25V, C0G, ±2%, SMD 0201; Manufacturer: Murata Electronics; Manufacturer Part Number: GRM0335C1E100GA01D; Package Size: 0201; JLCPCB Basic Part: No; JLCPCB Part Number: C161369; Supplier 1: LCSC; Category: Capacitors - MLCC; Supplier Part Number 1: C161369; Tolerance: ±2%; Voltage Rating: 25V; Temperature Coefficient: C0G; RoHS: Yes; ComponentLink1Description: Datasheet; ComponentLink1URL: https://wmsc.lcsc.com/wmsc/upload/file/pdf/v2/lcsc/1811081511_Murata-Electronics-GRM0335C1E100GA01D_C161369.pdf; ComponentLink2Description: JLCPCB Part URL; ComponentLink2URL: https://jlcpcb.com/partdetail/C161369; ComponentLink3Description: LCSC Part URL; ComponentLink3URL: https://lcsc.com/product-detail/Multilayer-Ceramic-Capacitors-MLCC---SMD-SMT_Murata-Electronics-Murata-Electronics-GRM0335C1E100GA01D_C161369.html
footprint CAP-0201 (0201 (0603M) Capacitor)
pins: 1, 2

## GRM0335C1E101FA01D
designator C?  Capacitance: 100pF  (hidden comment: *)
Capacitor, Ceramic (MLCC), 100pF, ±1%, 25V, C0G, ±1%, SMD 0201; Manufacturer: Murata Electronics; Manufacturer Part Number: GRM0335C1E101FA01D; Package Size: 0201; JLCPCB Basic Part: No; JLCPCB Part Number: C527989; Supplier 1: LCSC; Category: Capacitors - MLCC; Supplier Part Number 1: C527989; Tolerance: ±1%; Voltage Rating: 25V; Temperature Coefficient: C0G; RoHS: Yes; ComponentLink1Description: Datasheet; ComponentLink1URL: https://wmsc.lcsc.com/wmsc/upload/file/pdf/v2/lcsc/2304140030_Murata-Electronics-GRM0335C1E101FA01D_C527989.pdf; ComponentLink2Description: JLCPCB Part URL; ComponentLink2URL: https://jlcpcb.com/partdetail/C527989; ComponentLink3Description: LCSC Part URL; ComponentLink3URL: https://lcsc.com/product-detail/Multilayer-Ceramic-Capacitors-MLCC---SMD-SMT_Murata-Electronics-Murata-Electronics-GRM0335C1E101FA01D_C527989.html
footprint CAP-0201 (0201 (0603M) Capacitor)
pins: 1, 2

## GRM0335C1E101JA01D
designator C?  Capacitance: 100pF  (hidden comment: *)
Capacitor, Ceramic (MLCC), 100pF, ±5%, 25V, C0G, ±5%, SMD 0201; Manufacturer: Murata Electronics; Manufacturer Part Number: GRM0335C1E101JA01D; Package Size: 0201; JLCPCB Basic Part: No; JLCPCB Part Number: C76917; Supplier 1: LCSC; Category: Capacitors - MLCC; Supplier Part Number 1: C76917; Tolerance: ±5%; Voltage Rating: 25V; Temperature Coefficient: C0G; RoHS: Yes; ComponentLink1Description: Datasheet; ComponentLink1URL: https://wmsc.lcsc.com/wmsc/upload/file/pdf/v2/lcsc/1811081531_Murata-Electronics-GRM0335C1E101JA01D_C76917.pdf; ComponentLink2Description: JLCPCB Part URL; ComponentLink2URL: https://jlcpcb.com/partdetail/C76917; ComponentLink3Description: LCSC Part URL; ComponentLink3URL: https://lcsc.com/product-detail/Multilayer-Ceramic-Capacitors-MLCC---SMD-SMT_Murata-Electronics-Murata-Electronics-GRM0335C1E101JA01D_C76917.html
footprint CAP-0201 (0201 (0603M) Capacitor)
pins: 1, 2

## GRM0335C1E110JA01D
designator C?  Capacitance: 11pF  (hidden comment: *)
Capacitor, Ceramic (MLCC), 11pF, ±5%, 25V, null, ±5%, SMD 0201; Manufacturer: Murata Electronics; Manufacturer Part Number: GRM0335C1E110JA01D; Package Size: 0201; JLCPCB Basic Part: No; JLCPCB Part Number: C2183483; Supplier 1: LCSC; Category: Capacitors - MLCC; Supplier Part Number 1: C2183483; Tolerance: ±5%; Voltage Rating: 25V; Temperature Coefficient: null; RoHS: Yes; ComponentLink1Description: Datasheet; ComponentLink1URL: https://wmsc.lcsc.com/wmsc/upload/file/pdf/v2/lcsc/2308111719_Murata-Electronics-GRM0335C1E110JA01D_C2183483.pdf; ComponentLink2Description: JLCPCB Part URL; ComponentLink2URL: https://jlcpcb.com/partdetail/C2183483; ComponentLink3Description: LCSC Part URL; ComponentLink3URL: https://lcsc.com/product-detail/Multilayer-Ceramic-Capacitors-MLCC---SMD-SMT_Murata-Electronics-Murata-Electronics-GRM0335C1E110JA01D_C2183483.html
footprint CAP-0201 (0201 (0603M) Capacitor)
pins: 1, 2

## GRM0335C1E120FA01D
designator C?  Capacitance: 12pF  (hidden comment: *)
Capacitor, Ceramic (MLCC), 12pF, ±1%, 25V, C0G, ±1%, SMD 0201; Manufacturer: Murata Electronics; Manufacturer Part Number: GRM0335C1E120FA01D; Package Size: 0201; JLCPCB Basic Part: No; JLCPCB Part Number: C3034520; Supplier 1: LCSC; Category: Capacitors - MLCC; Supplier Part Number 1: C3034520; Tolerance: ±1%; Voltage Rating: 25V; Temperature Coefficient: C0G; RoHS: Yes; ComponentLink1Description: Datasheet; ComponentLink1URL: https://wmsc.lcsc.com/wmsc/upload/file/pdf/v2/lcsc/2209091800_Murata-Electronics-GRM0335C1E120FA01D_C3034520.pdf; ComponentLink2Description: JLCPCB Part URL; ComponentLink2URL: https://jlcpcb.com/partdetail/C3034520; ComponentLink3Description: LCSC Part URL; ComponentLink3URL: https://lcsc.com/product-detail/Multilayer-Ceramic-Capacitors-MLCC---SMD-SMT_Murata-Electronics-Murata-Electronics-GRM0335C1E120FA01D_C3034520.html
footprint CAP-0201 (0201 (0603M) Capacitor)
pins: 1, 2

## GRM0335C1E120GA01D
designator C?  Capacitance: 12pF  (hidden comment: *)
Capacitor, Ceramic (MLCC), 12pF, ±2%, 25V, C0G, ±2%, SMD 0201; Manufacturer: Murata Electronics; Manufacturer Part Number: GRM0335C1E120GA01D; Package Size: 0201; JLCPCB Basic Part: No; JLCPCB Part Number: C426109; Supplier 1: LCSC; Category: Capacitors - MLCC; Supplier Part Number 1: C426109; Tolerance: ±2%; Voltage Rating: 25V; Temperature Coefficient: C0G; RoHS: Yes; ComponentLink1Description: Datasheet; ComponentLink1URL: https://wmsc.lcsc.com/wmsc/upload/file/pdf/v2/lcsc/2304140030_Murata-Electronics-GRM0335C1E120GA01D_C426109.pdf; ComponentLink2Description: JLCPCB Part URL; ComponentLink2URL: https://jlcpcb.com/partdetail/C426109; ComponentLink3Description: LCSC Part URL; ComponentLink3URL: https://lcsc.com/product-detail/Multilayer-Ceramic-Capacitors-MLCC---SMD-SMT_Murata-Electronics-Murata-Electronics-GRM0335C1E120GA01D_C426109.html
footprint CAP-0201 (0201 (0603M) Capacitor)
pins: 1, 2

## GRM0335C1E120JA01D
designator C?  Capacitance: 12pF  (hidden comment: *)
Capacitor, Ceramic (MLCC), 12pF, ±5%, 25V, C0G, ±5%, SMD 0201; Manufacturer: Murata Electronics; Manufacturer Part Number: GRM0335C1E120JA01D; Package Size: 0201; JLCPCB Basic Part: No; JLCPCB Part Number: C161372; Supplier 1: LCSC; Category: Capacitors - MLCC; Supplier Part Number 1: C161372; Tolerance: ±5%; Voltage Rating: 25V; Temperature Coefficient: C0G; RoHS: Yes; ComponentLink1Description: Datasheet; ComponentLink1URL: https://wmsc.lcsc.com/wmsc/upload/file/pdf/v2/lcsc/1811081533_Murata-Electronics-GRM0335C1E120JA01D_C161372.pdf; ComponentLink2Description: JLCPCB Part URL; ComponentLink2URL: https://jlcpcb.com/partdetail/C161372; ComponentLink3Description: LCSC Part URL; ComponentLink3URL: https://lcsc.com/product-detail/Multilayer-Ceramic-Capacitors-MLCC---SMD-SMT_Murata-Electronics-Murata-Electronics-GRM0335C1E120JA01D_C161372.html
footprint CAP-0201 (0201 (0603M) Capacitor)
pins: 1, 2

## GRM0335C1E130JA01D
designator C?  Capacitance: 13pF  (hidden comment: *)
Capacitor, Ceramic (MLCC), 13pF, ±5%, 25V, null, ±5%, SMD 0201; Manufacturer: Murata Electronics; Manufacturer Part Number: GRM0335C1E130JA01D; Package Size: 0201; JLCPCB Basic Part: No; JLCPCB Part Number: C2171613; Supplier 1: LCSC; Category: Capacitors - MLCC; Supplier Part Number 1: C2171613; Tolerance: ±5%; Voltage Rating: 25V; Temperature Coefficient: null; RoHS: Yes; ComponentLink1Description: Datasheet; ComponentLink1URL: https://wmsc.lcsc.com/wmsc/upload/file/pdf/v2/lcsc/2202040530_Murata-Electronics-GRM0335C1E130JA01D_C2171613.pdf; ComponentLink2Description: JLCPCB Part URL; ComponentLink2URL: https://jlcpcb.com/partdetail/C2171613; ComponentLink3Description: LCSC Part URL; ComponentLink3URL: https://lcsc.com/product-detail/Multilayer-Ceramic-Capacitors-MLCC---SMD-SMT_Murata-Electronics-Murata-Electronics-GRM0335C1E130JA01D_C2171613.html
footprint CAP-0201 (0201 (0603M) Capacitor)
pins: 1, 2

## GRM0335C1E150FA01D
designator C?  Capacitance: 15pF  (hidden comment: *)
Capacitor, Ceramic (MLCC), 15pF, ±1%, 25V, C0G, ±1%, SMD 0201; Manufacturer: Murata Electronics; Manufacturer Part Number: GRM0335C1E150FA01D; Package Size: 0201; JLCPCB Basic Part: No; JLCPCB Part Number: C668337; Supplier 1: LCSC; Category: Capacitors - MLCC; Supplier Part Number 1: C668337; Tolerance: ±1%; Voltage Rating: 25V; Temperature Coefficient: C0G; RoHS: Yes; ComponentLink1Description: Datasheet; ComponentLink1URL: https://wmsc.lcsc.com/wmsc/upload/file/pdf/v2/lcsc/2202281730_Murata-Electronics-GRM0335C1E150FA01D_C668337.pdf; ComponentLink2Description: JLCPCB Part URL; ComponentLink2URL: https://jlcpcb.com/partdetail/C668337; ComponentLink3Description: LCSC Part URL; ComponentLink3URL: https://lcsc.com/product-detail/Multilayer-Ceramic-Capacitors-MLCC---SMD-SMT_Murata-Electronics-Murata-Electronics-GRM0335C1E150FA01D_C668337.html
footprint CAP-0201 (0201 (0603M) Capacitor)
pins: 1, 2

## GRM0335C1E150JA01D
designator C?  Capacitance: 15pF  (hidden comment: *)
Capacitor, Ceramic (MLCC), 15pF, ±5%, 25V, C0G, ±5%, SMD 0201; Manufacturer: Murata Electronics; Manufacturer Part Number: GRM0335C1E150JA01D; Package Size: 0201; JLCPCB Basic Part: No; JLCPCB Part Number: C161373; Supplier 1: LCSC; Category: Capacitors - MLCC; Supplier Part Number 1: C161373; Tolerance: ±5%; Voltage Rating: 25V; Temperature Coefficient: C0G; RoHS: Yes; ComponentLink1Description: Datasheet; ComponentLink1URL: https://wmsc.lcsc.com/wmsc/upload/file/pdf/v2/lcsc/2304140030_Murata-Electronics-GRM0335C1E150JA01D_C161373.pdf; ComponentLink2Description: JLCPCB Part URL; ComponentLink2URL: https://jlcpcb.com/partdetail/C161373; ComponentLink3Description: LCSC Part URL; ComponentLink3URL: https://lcsc.com/product-detail/Multilayer-Ceramic-Capacitors-MLCC---SMD-SMT_Murata-Electronics-Murata-Electronics-GRM0335C1E150JA01D_C161373.html
footprint CAP-0201 (0201 (0603M) Capacitor)
pins: 1, 2

## GRM0335C1E151JA01D
designator C?  Capacitance: 150pF  (hidden comment: *)
Capacitor, Ceramic (MLCC), 150pF, ±5%, 25V, null, ±5%, SMD 0201; Manufacturer: Murata Electronics; Manufacturer Part Number: GRM0335C1E151JA01D; Package Size: 0201; JLCPCB Basic Part: No; JLCPCB Part Number: C710793; Supplier 1: LCSC; Category: Capacitors - MLCC; Supplier Part Number 1: C710793; Tolerance: ±5%; Voltage Rating: 25V; Temperature Coefficient: null; RoHS: Yes; ComponentLink1Description: Datasheet; ComponentLink1URL: https://wmsc.lcsc.com/wmsc/upload/file/pdf/v2/lcsc/2103161034_Murata-Electronics-GRM0335C1E151JA01D_C710793.pdf; ComponentLink2Description: JLCPCB Part URL; ComponentLink2URL: https://jlcpcb.com/partdetail/C710793; ComponentLink3Description: LCSC Part URL; ComponentLink3URL: https://lcsc.com/product-detail/Multilayer-Ceramic-Capacitors-MLCC---SMD-SMT_Murata-Electronics-Murata-Electronics-GRM0335C1E151JA01D_C710793.html
footprint CAP-0201 (0201 (0603M) Capacitor)
pins: 1, 2

## GRM0335C1E160FA01D
designator C?  Capacitance: 16pF  (hidden comment: *)
Capacitor, Ceramic (MLCC), 16pF, ±1%, 25V, C0G, ±1%, SMD 0201; Manufacturer: Murata Electronics; Manufacturer Part Number: GRM0335C1E160FA01D; Package Size: 0201; JLCPCB Basic Part: No; JLCPCB Part Number: C3034519; Supplier 1: LCSC; Category: Capacitors - MLCC; Supplier Part Number 1: C3034519; Tolerance: ±1%; Voltage Rating: 25V; Temperature Coefficient: C0G; RoHS: Yes; ComponentLink1Description: Datasheet; ComponentLink1URL: https://wmsc.lcsc.com/wmsc/upload/file/pdf/v2/lcsc/2209091800_Murata-Electronics-GRM0335C1E160FA01D_C3034519.pdf; ComponentLink2Description: JLCPCB Part URL; ComponentLink2URL: https://jlcpcb.com/partdetail/C3034519; ComponentLink3Description: LCSC Part URL; ComponentLink3URL: https://lcsc.com/product-detail/Multilayer-Ceramic-Capacitors-MLCC---SMD-SMT_Murata-Electronics-Murata-Electronics-GRM0335C1E160FA01D_C3034519.html
footprint CAP-0201 (0201 (0603M) Capacitor)
pins: 1, 2
